# Altium footprint library Maxwell_LIB.PcbLib: 143 footprints (part 7 of 9)
Each footprint in its own frame and in the unit in brackets; x right, y up, seen from the top. Pads: shape width x height; smd on the part's side, far side on the other; paste and mask are expansions set on the pad; w line width, h text height; cw(c..) or ccw(c..) is an arc to the next point about the centre after c.
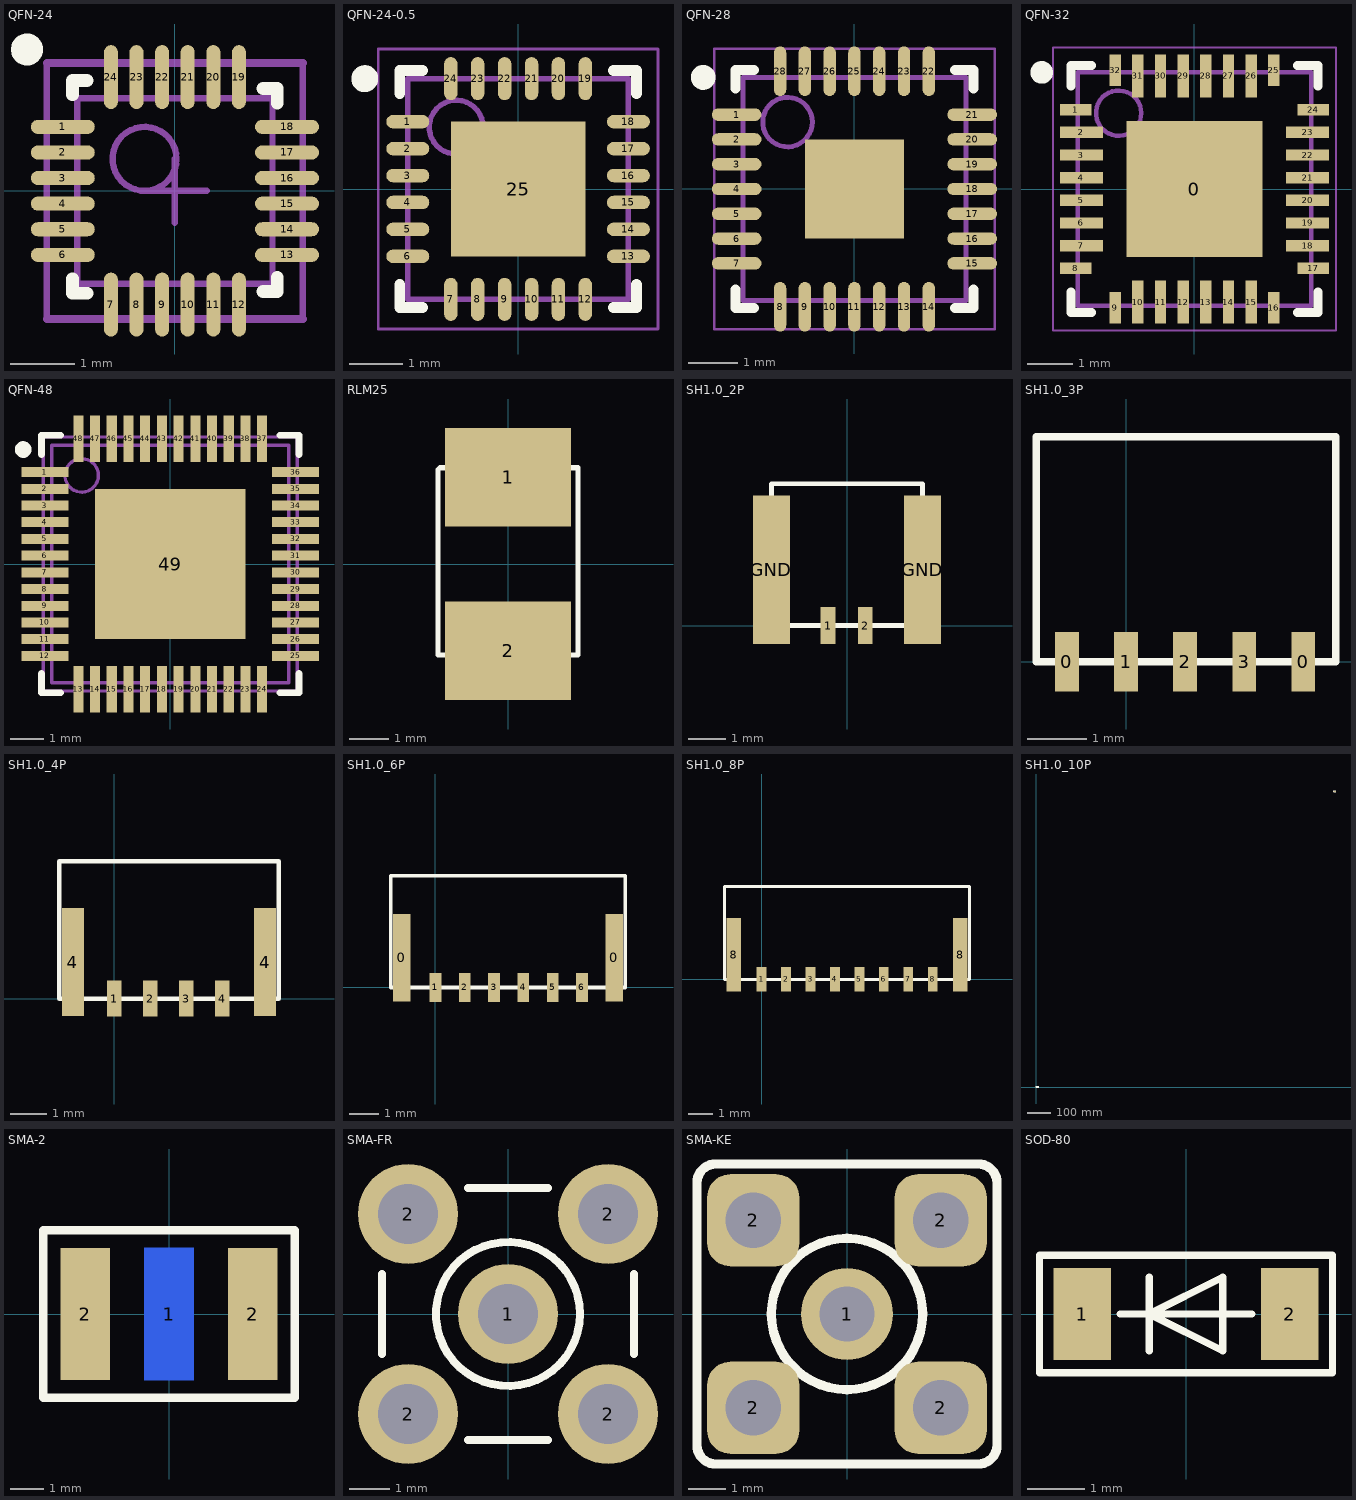
[diagram p6: the footprints below, top view; thin cyan lines are the x and y axes]

## QFN-24 [mm]
pads (24):
  oval 1x0.22 smd: 1(-1.752,1) 2(-1.752,0.6) 3(-1.752,0.2) 4(-1.752,-0.2) 5(-1.752,-0.6) 6(-1.752,-1) 13(1.752,-1) 14(1.752,-0.6) 15(1.752,-0.2) 16(1.752,0.2) 17(1.752,0.6) 18(1.752,1)
  oval 0.22x1 smd: 7(-1,-1.777) 8(-0.6,-1.777) 9(-0.2,-1.777) 10(0.2,-1.777) 11(0.6,-1.777) 12(1,-1.777) 19(1,1.777) 20(0.6,1.777) 21(0.2,1.777) 22(-0.2,1.777) 23(-0.6,1.777) 24(-1,1.777)
Top Overlay:
  circle w0.25: c-2.311,2.21 r0.125
  lines w0.2: -1.6,-1.375 -1.6,-1.6 -1.375,-1.6 ; -1.6,1.502 -1.6,1.727 -1.375,1.727 ; 1.375,-1.575 1.6,-1.575 1.6,-1.35 ; 1.375,1.6 1.6,1.6 1.6,1.375
Mechanical 13:
  circle w0.1: c-0.475,0.5 r0.5
  lines w0.1: -1.525,-1.45 1.525,-1.45 1.525,1.45 -1.525,1.45 -1.525,-1.45
Mechanical 15:
  lines w0.1: -2,-2 -2,2 ; -0.5,0 0.5,0 ; 0,-0.5 0,0.5 ; 2,-2 2,2
  lines w0.127: -2,-2 2,-2 ; -2,2 2,2
3D body "QFN24.STEP": height 0.98, standoff -0.02, extent -1.475,-1.493 1.525,1.507

## QFN-24-0.5 [mm] "QFN, 24-Leads, Body 4.00x4.00mm, Pitch 0.50mm, Thermal Pad 2.75x2.75mm, IPC Medium Density"
height 0.8
pads (25):
  oval 0.8x0.25 smd: 1(-2.05,1.25) 2(-2.05,0.75) 3(-2.05,0.25) 4(-2.05,-0.25) 5(-2.05,-0.75) 6(-2.05,-1.25) 13(2.05,-1.25) 14(2.05,-0.75) 15(2.05,-0.25) 16(2.05,0.25) 17(2.05,0.75) 18(2.05,1.25)
  oval 0.25x0.8 smd: 7(-1.25,-2.05) 8(-0.75,-2.05) 9(-0.25,-2.05) 10(0.25,-2.05) 11(0.75,-2.05) 12(1.25,-2.05) 19(1.25,2.05) 20(0.75,2.05) 21(0.25,2.05) 22(-0.25,2.05) 23(-0.75,2.05) 24(-1.25,2.05)
  rect 2.5x2.5 smd: 25(0,0)
Top Overlay:
  circle w0.25: c-2.85,2.05 r0.125
  lines w0.2: -2.2,-1.775 -2.2,-2.2 -1.775,-2.2 ; -2.2,1.775 -2.2,2.2 -1.775,2.2 ; 1.775,-2.2 2.2,-2.2 2.2,-1.775 ; 1.775,2.2 2.2,2.2 2.2,1.775
Mechanical 13:
  circle w0.1: c-1.15,1.15 r0.5
  lines w0.1: -2.05,-2.05 2.05,-2.05 2.05,2.05 -2.05,2.05 -2.05,-2.05
Mechanical 15:
  lines w0.05: -2.6,-2.6 2.6,-2.6 2.6,2.6 -2.6,2.6 -2.6,-2.6
  lines w0.1: -0.5,0 0.5,0 ; 0,-0.5 0,0.5
3D body "User Library-QFN24.STEP": height 0.9, standoff 0, extent -2.005,-2.005 2.005,2.005

## QFN-28 [mm] "QFN, 28-Leads, Body 4.50x4.50mm, Pitch 0.50mm, Thermal Pad 2.00x2.00mm, IPC Medium Density"
height 0.8
pads (29):
  oval 1x0.25 smd: 1(-2.375,1.5) 2(-2.375,1) 3(-2.375,0.5) 4(-2.375,0) 5(-2.375,-0.5) 6(-2.375,-1) 7(-2.375,-1.5) 15(2.375,-1.5) 16(2.375,-1) 17(2.375,-0.5) 18(2.375,0) 19(2.375,0.5) 20(2.375,1) 21(2.375,1.5)
  oval 0.25x1 smd: 8(-1.5,-2.375) 9(-1,-2.375) 10(-0.5,-2.375) 11(0,-2.375) 12(0.5,-2.375) 13(1,-2.375) 14(1.5,-2.375) 22(1.5,2.375) 23(1,2.375) 24(0.5,2.375) 25(0,2.375) 26(-0.5,2.375) 27(-1,2.375) 28(-1.5,2.375)
  rect 2x2 smd: ""(0,0)
Top Overlay:
  circle w0.25: c-3.05,2.25 r0.125
  lines w0.2: -2.4,-2.025 -2.4,-2.4 -2.025,-2.4 ; -2.4,2.025 -2.4,2.4 -2.025,2.4 ; 2.025,-2.4 2.4,-2.4 2.4,-2.025 ; 2.025,2.4 2.4,2.4 2.4,2.025
Mechanical 13:
  circle w0.1: c-1.35,1.35 r0.5
  lines w0.1: -2.25,-2.25 -2.25,2.25 2.25,2.25 2.25,-2.25 -2.25,-2.25
Mechanical 15:
  lines w0.05: -2.825,-2.825 -2.825,2.825 2.825,2.825 2.825,-2.825 -2.825,-2.825
  lines w0.1: -0.5,0 0.5,0 ; 0,-0.5 0,0.5
3D body "User Library-QFN28.step": height 0.9, standoff 0, extent -2.52,-2.52 2.52,2.52

## QFN-32 [mm] "QFN, 32-Leads, Body 5.00x5.00mm, Pitch 0.50mm, Thermal Pad 3.45x3.45mm, IPC Medium Density"
height 1
pads (33):
  rect 3x3 smd: 0(0,0)
  rect 0.7x0.25 smd: 1(-2.625,1.75) 8(-2.625,-1.75) 17(2.625,-1.75) 24(2.625,1.75)
  rect 0.95x0.25 smd: 2(-2.5,1.25) 3(-2.5,0.75) 4(-2.5,0.25) 5(-2.5,-0.25) 6(-2.5,-0.75) 7(-2.5,-1.25) 18(2.5,-1.25) 19(2.5,-0.75) 20(2.5,-0.25) 21(2.5,0.25) 22(2.5,0.75) 23(2.5,1.25)
  rect 0.25x0.7 smd: 9(-1.75,-2.625) 16(1.75,-2.625) 25(1.75,2.625) 32(-1.75,2.625)
  rect 0.25x0.95 smd: 10(-1.25,-2.5) 11(-0.75,-2.5) 12(-0.25,-2.5) 13(0.25,-2.5) 14(0.75,-2.5) 15(1.25,-2.5) 26(1.25,2.5) 27(0.75,2.5) 28(0.25,2.5) 29(-0.25,2.5) 30(-0.75,2.5) 31(-1.25,2.5)
Top Overlay:
  circle w0.25: c-3.375,2.575 r0.125
  lines w0.2: -2.725,-2.275 -2.725,-2.725 -2.275,-2.725 ; -2.725,2.275 -2.725,2.725 -2.275,2.725 ; 2.275,-2.725 2.725,-2.725 2.725,-2.275 ; 2.275,2.725 2.725,2.725 2.725,2.275
Mechanical 13:
  circle w0.1: c-1.675,1.675 r0.5
  lines w0.1: -2.575,-2.575 2.575,-2.575 2.575,2.575 -2.575,2.575 -2.575,-2.575
Mechanical 15:
  lines w0.05: -3.125,-3.125 3.125,-3.125 3.125,3.125 -3.125,3.125 -3.125,-3.125
  lines w0.1: -0.5,0 0.5,0 ; 0,-0.5 0,0.5
3D body "QFN-32.STEP": height 0.75, standoff 0, extent -2.51,-2.51 2.51,2.51

## QFN-48 [mm] "QFN, 48-Leads, Body 7x7mm, Pitch 0.5mm, NSC Recommended"
height 0.8
pads (49):
  rect 1.4x0.3 smd paste-0.125 mask+0.051: 1(-3.75,2.75) 2(-3.75,2.25) 3(-3.75,1.75) 4(-3.75,1.25) 5(-3.75,0.75) 6(-3.75,0.25) 7(-3.75,-0.25) 8(-3.75,-0.75) 9(-3.75,-1.25) 10(-3.75,-1.75) 11(-3.75,-2.25) 12(-3.75,-2.75) 25(3.75,-2.75) 26(3.75,-2.25) 27(3.75,-1.75) 28(3.75,-1.25) 29(3.75,-0.75) 30(3.75,-0.25) 31(3.75,0.25) 32(3.75,0.75) 33(3.75,1.25) 34(3.75,1.75) 35(3.75,2.25) 36(3.75,2.75)
  rect 0.3x1.4 smd paste-0.125 mask+0.051: 13(-2.75,-3.75) 14(-2.25,-3.75) 15(-1.75,-3.75) 16(-1.25,-3.75) 17(-0.75,-3.75) 18(-0.25,-3.75) 19(0.25,-3.75) 20(0.75,-3.75) 21(1.25,-3.75) 22(1.75,-3.75) 23(2.25,-3.75) 24(2.75,-3.75) 37(2.75,3.75) 38(2.25,3.75) 39(1.75,3.75) 40(1.25,3.75) 41(0.75,3.75) 42(0.25,3.75) 43(-0.25,3.75) 44(-0.75,3.75) 45(-1.25,3.75) 46(-1.75,3.75) 47(-2.25,3.75) 48(-2.75,3.75)
  rect 4.5x4.5 smd paste-2.55 mask+0.051: 49(0,0)
Top Overlay:
  circle w0.25: c-4.4,3.425 r0.125
  lines w0.2: -3.85,-3.275 -3.85,-3.85 -3.275,-3.85 ; -3.85,3.275 -3.85,3.85 -3.275,3.85 ; 3.275,-3.85 3.85,-3.85 3.85,-3.275 ; 3.275,3.85 3.85,3.85 3.85,3.275
Top Paste:
  rectangle: -3.9,2.625 -3.2,2.875
  rectangle: -3.9,2.125 -3.2,2.375
  rectangle: -3.9,1.625 -3.2,1.875
  rectangle: -3.9,1.125 -3.2,1.375
  rectangle: -3.9,0.625 -3.2,0.875
  rectangle: -3.9,0.125 -3.2,0.375
  rectangle: -3.9,-0.375 -3.2,-0.125
  rectangle: -3.9,-0.875 -3.2,-0.625
  rectangle: -3.9,-1.375 -3.2,-1.125
  rectangle: -3.9,-1.875 -3.2,-1.625
  rectangle: -3.9,-2.375 -3.2,-2.125
  rectangle: -3.9,-2.875 -3.2,-2.625
  region: 2.875,-3.9 2.875,-3.2 2.625,-3.2 2.625,-3.9
  region: 2.375,-3.9 2.375,-3.2 2.125,-3.2 2.125,-3.9
  region: 1.875,-3.9 1.875,-3.2 1.625,-3.2 1.625,-3.9
  region: 1.375,-3.9 1.375,-3.2 1.125,-3.2 1.125,-3.9
  region: 0.875,-3.9 0.875,-3.2 0.625,-3.2 0.625,-3.9
  region: 0.375,-3.9 0.375,-3.2 0.125,-3.2 0.125,-3.9
  region: -0.125,-3.9 -0.125,-3.2 -0.375,-3.2 -0.375,-3.9
  region: -0.625,-3.9 -0.625,-3.2 -0.875,-3.2 -0.875,-3.9
  region: -1.125,-3.9 -1.125,-3.2 -1.375,-3.2 -1.375,-3.9
  region: -1.625,-3.9 -1.625,-3.2 -1.875,-3.2 -1.875,-3.9
  region: -2.125,-3.9 -2.125,-3.2 -2.375,-3.2 -2.375,-3.9
  region: -2.625,-3.9 -2.625,-3.2 -2.875,-3.2 -2.875,-3.9
  region: 3.9,2.875 3.2,2.875 3.2,2.625 3.9,2.625
  region: 3.9,2.375 3.2,2.375 3.2,2.125 3.9,2.125
  region: 3.9,1.875 3.2,1.875 3.2,1.625 3.9,1.625
  region: 3.9,1.375 3.2,1.375 3.2,1.125 3.9,1.125
  region: 3.9,0.875 3.2,0.875 3.2,0.625 3.9,0.625
  region: 3.9,0.375 3.2,0.375 3.2,0.125 3.9,0.125
  region: 3.9,-0.125 3.2,-0.125 3.2,-0.375 3.9,-0.375
  region: 3.9,-0.625 3.2,-0.625 3.2,-0.875 3.9,-0.875
  region: 3.9,-1.125 3.2,-1.125 3.2,-1.375 3.9,-1.375
  region: 3.9,-1.625 3.2,-1.625 3.2,-1.875 3.9,-1.875
  region: 3.9,-2.125 3.2,-2.125 3.2,-2.375 3.9,-2.375
  region: 3.9,-2.625 3.2,-2.625 3.2,-2.875 3.9,-2.875
  region: -2.875,3.9 -2.875,3.2 -2.625,3.2 -2.625,3.9
  region: -2.375,3.9 -2.375,3.2 -2.125,3.2 -2.125,3.9
  region: -1.875,3.9 -1.875,3.2 -1.625,3.2 -1.625,3.9
  region: -1.375,3.9 -1.375,3.2 -1.125,3.2 -1.125,3.9
  region: -0.875,3.9 -0.875,3.2 -0.625,3.2 -0.625,3.9
  region: -0.375,3.9 -0.375,3.2 -0.125,3.2 -0.125,3.9
  region: 0.125,3.9 0.125,3.2 0.375,3.2 0.375,3.9
  region: 0.625,3.9 0.625,3.2 0.875,3.2 0.875,3.9
  region: 1.125,3.9 1.125,3.2 1.375,3.2 1.375,3.9
  region: 1.625,3.9 1.625,3.2 1.875,3.2 1.875,3.9
  region: 2.125,3.9 2.125,3.2 2.375,3.2 2.375,3.9
  region: 2.625,3.9 2.625,3.2 2.875,3.2 2.875,3.9
  rectangle: 0.1,0.1 1.2,1.2
  rectangle: 0.1,1.4 1.2,2.5
  rectangle: 1.4,0.1 2.5,1.2
  rectangle: 1.4,1.4 2.5,2.5
  region: -1.4,2.5 -2.5,2.5 -2.5,1.4 -1.4,1.4
  region: -1.4,1.2 -2.5,1.2 -2.5,0.1 -1.4,0.1
  region: -0.1,2.5 -1.2,2.5 -1.2,1.4 -0.1,1.4
  region: -0.1,1.2 -1.2,1.2 -1.2,0.1 -0.1,0.1
  region: -2.5,-1.4 -2.5,-2.5 -1.4,-2.5 -1.4,-1.4
  region: -1.2,-1.4 -1.2,-2.5 -0.1,-2.5 -0.1,-1.4
  region: -2.5,-0.1 -2.5,-1.2 -1.4,-1.2 -1.4,-0.1
  region: -1.2,-0.1 -1.2,-1.2 -0.1,-1.2 -0.1,-0.1
  region: 1.4,-1.4 1.4,-2.5 2.5,-2.5 2.5,-1.4
  region: 0.1,-1.4 0.1,-2.5 1.2,-2.5 1.2,-1.4
  region: 1.4,-0.1 1.4,-1.2 2.5,-1.2 2.5,-0.1
  region: 0.1,-0.1 0.1,-1.2 1.2,-1.2 1.2,-0.1
Mechanical 13:
  circle w0.1: c-2.65,2.65 r0.5
  lines w0.1: -3.55,-3.55 3.55,-3.55 3.55,3.55 -3.55,3.55 -3.55,-3.55
Mechanical 15:
  lines w0.1: -0.5,0 0.5,0 ; 0,-0.5 0,0.5 ; -3.8,-3.8 3.8,-3.8 3.8,3.8 -3.8,3.8 -3.8,-3.8
3D body "QFN_48.STEP": height 1, standoff -0.1, extent -3.5,-3.5 3.5,3.5

## RLM25 [mm]
pads (2):
  rect 3.2x2.5 smd: 1(0,2.2) 2(0,-2.2)
Top Overlay:
  lines w0.127: -1.778,-2.311 1.778,-2.311 1.778,2.438 -1.727,2.438 -1.778,2.388 -1.778,-2.311
3D body: height 1.5, standoff 0, extent -1.626,-2.21 1.626,2.311

## SH1.0_2P [mm]
pads (4):
  rect 0.4x1 smd: 1(-0.508,0) 2(0.492,0)
  rect 1x4 smd: GND(-2.032,1.499) GND(2.032,1.499)
Top Overlay:
  lines w0.127: -2.032,0 -2.032,3.81 2.032,3.81 2.032,0 -2.032,0
3D body "SH1.0_2P.stp": height 2.9, standoff 0, extent -1.949,-0.471 2.051,4.479

## SH1.0_3P [mm]
pads (5):
  rect 0.4x1 smd: 0(-1,0) 0(3,0) 1(0,0) 2(1,0) 3(2,0)
Top Overlay:
  lines w0.127: -1.524,0 -1.524,3.81 3.556,3.81 3.556,0 -1.524,0

## SH1.0_4P [mm]
pads (6):
  rect 0.4x1 smd: 1(0,0) 2(1,0) 3(2,0) 4(3,0)
  rect 0.6x3 smd: 4(-1.143,1.016) 4(4.191,1.016)
Top Overlay:
  lines w0.127: -1.524,0 -1.524,3.81 4.572,3.81 4.572,0 -1.524,0
3D body "SH1.0_5P.STEP": height 2.9, standoff 0, extent -1.369,-3.032 5.631,1.918

## SH1.0_6P [mm]
pads (8):
  rect 0.6x3 smd: 0(-1.143,1.016) 0(6.096,1.016)
  rect 0.4x1 smd: 1(0,0) 2(1,0) 3(2,0) 4(3,0) 5(4,0) 6(5,0)
Top Overlay:
  lines w0.127: -1.524,0 6.477,0 6.477,3.81 -1.524,3.81 -1.524,0
3D body: height 3, standoff 0, extent -1.143,0.254 6.096,3.81

## SH1.0_8P [mm]
pads (10):
  rect 0.4x1 smd: 1(0,0) 2(1,0) 3(2,0) 4(3,0) 5(4,0) 6(5,0) 7(6,0) 8(7,0)
  rect 0.6x3 smd: 8(-1.143,1.016) 8(8.128,1.016)
Top Overlay:
  lines w0.127: -1.524,0 -1.524,3.81 8.509,3.81 8.509,0 -1.524,0
3D body: height 3, standoff 0, extent -1.143,0.254 8.128,3.81

## SH1.0_10P [mm]
pads (22):
  rect 0.4x1 smd: 1(0,0) 1(1278.509,1270) 2(1,0) 2(1279.509,1270) 3(2,0) 3(1280.509,1270) 4(3,0) 4(1281.509,1270) 5(4,0) 5(1282.509,1270) 6(5,0) 6(1277.509,1270) 6(1283.509,1270) 7(6,0) 7(1284.509,1270) 8(7,0) 8(1285.509,1270) 8(1286.509,1270) 9(8,0) 10(-1,0) 10(9,0) 10(10,0)
Top Overlay:
  lines w0.127: -1.524,0 -1.524,3.81 10.541,3.81 10.541,0 -1.524,0 ; 1276.985,1270 1287.018,1270 1287.018,1273.81 1276.985,1273.81 1276.985,1270

## SMA-2 [mm]
pads (3):
  rect 1.5x4 smd far side: 1(0,0)
  rect 1.5x4 all layers, no hole: 2(-2.54,0) 2(2.54,0)
Top Overlay:
  lines w0.254: -3.81,-2.54 -3.81,-2.286 -3.81,2.54 3.81,2.54 3.81,-2.54 -3.81,-2.54
3D body "User Library-620-SMA-02-112-TGG SMA Female for PCB edge Mount.step": height 3.2, standoff -2.85, extent -3,-11.886 3,1.714

## SMA-FR [mm]
pads (5):
  round 2.5 hole 1.5: 1(0,0) 2(-2.5,-2.5) 2(-2.5,2.5) 2(2.5,-2.5) 2(2.5,2.5)
Top Overlay:
  circle w0.2: c0,0 r1.8
  lines w0.2: -3.15,-1 -3.15,1 ; -1,-3.15 1,-3.15 ; -1,3.15 1,3.15 ; 3.15,-1 3.15,1
Mechanical 1:
  circle w0.025: c0,0 r0.2
  circle w0.025: c0,0 r1.05
  circle w0.025: c0,0 r1.8
3D body "Samtec-SMA-J-P-H-RA-TH1.STEP": height 10.26, standoff -3.84, extent -3.5,-3.5 3.5,11.6

## SMA-KE [mm]
pads (5):
  round 2.5 hole 1.5: 1(0,0)
  rrect50% 2.5x2.5 hole 1.5: 2(-2.54,-2.54) 2(-2.54,2.54) 2(2.54,-2.54) 2(2.54,2.54)
Top Overlay:
  circle w0.254: c0,0 r2.048
  lines w0.2: 4.064,-3.556 4.064,-3.556 ; 4.064,-3.556 4.064,-3.556
  lines w0.254: 3.556,4.064 cw(c3.556,3.556) 4.064,3.556 4.064,-3.556 cw(c3.556,-3.556) 3.556,-4.064 -3.556,-4.064 cw(c-3.556,-3.556) -4.064,-3.556 -4.064,3.556 cw(c-3.556,3.556) -3.556,4.064 3.556,4.064 ; 3.556,4.064 3.556,4.064
3D body "SMA-KE.stp": height 10, standoff -3.5, extent -3.098,-3.581 3.302,2.819

## SOD-80 [mm]
pads (2):
  rect 1x1.6 smd: 1(-1.8,0) 2(1.8,0)
Top Overlay:
  lines w0.127: -1.143,0 1.143,0 ; -0.635,-0.635 -0.635,0.635 ; -2.54,-1.016 2.54,-1.016 2.54,1.016 -2.54,1.016 -2.54,-1.016 ; -0.635,0 0.635,-0.635 0.635,0.635 -0.635,0
3D body "SOD-80.STEP": height 1.6, standoff 0, extent -1.88,-0.798 1.82,0.798